# Altium footprint library DIP Component.PcbLib: 327 footprints (part 12 of 21)
Each footprint in its own frame and in the unit in brackets; x right, y up, seen from the top. Pads: shape width x height; smd on the part's side, far side on the other; paste and mask are expansions set on the pad; w line width, h text height; cw(c..) or ccw(c..) is an arc to the next point about the centre after c.
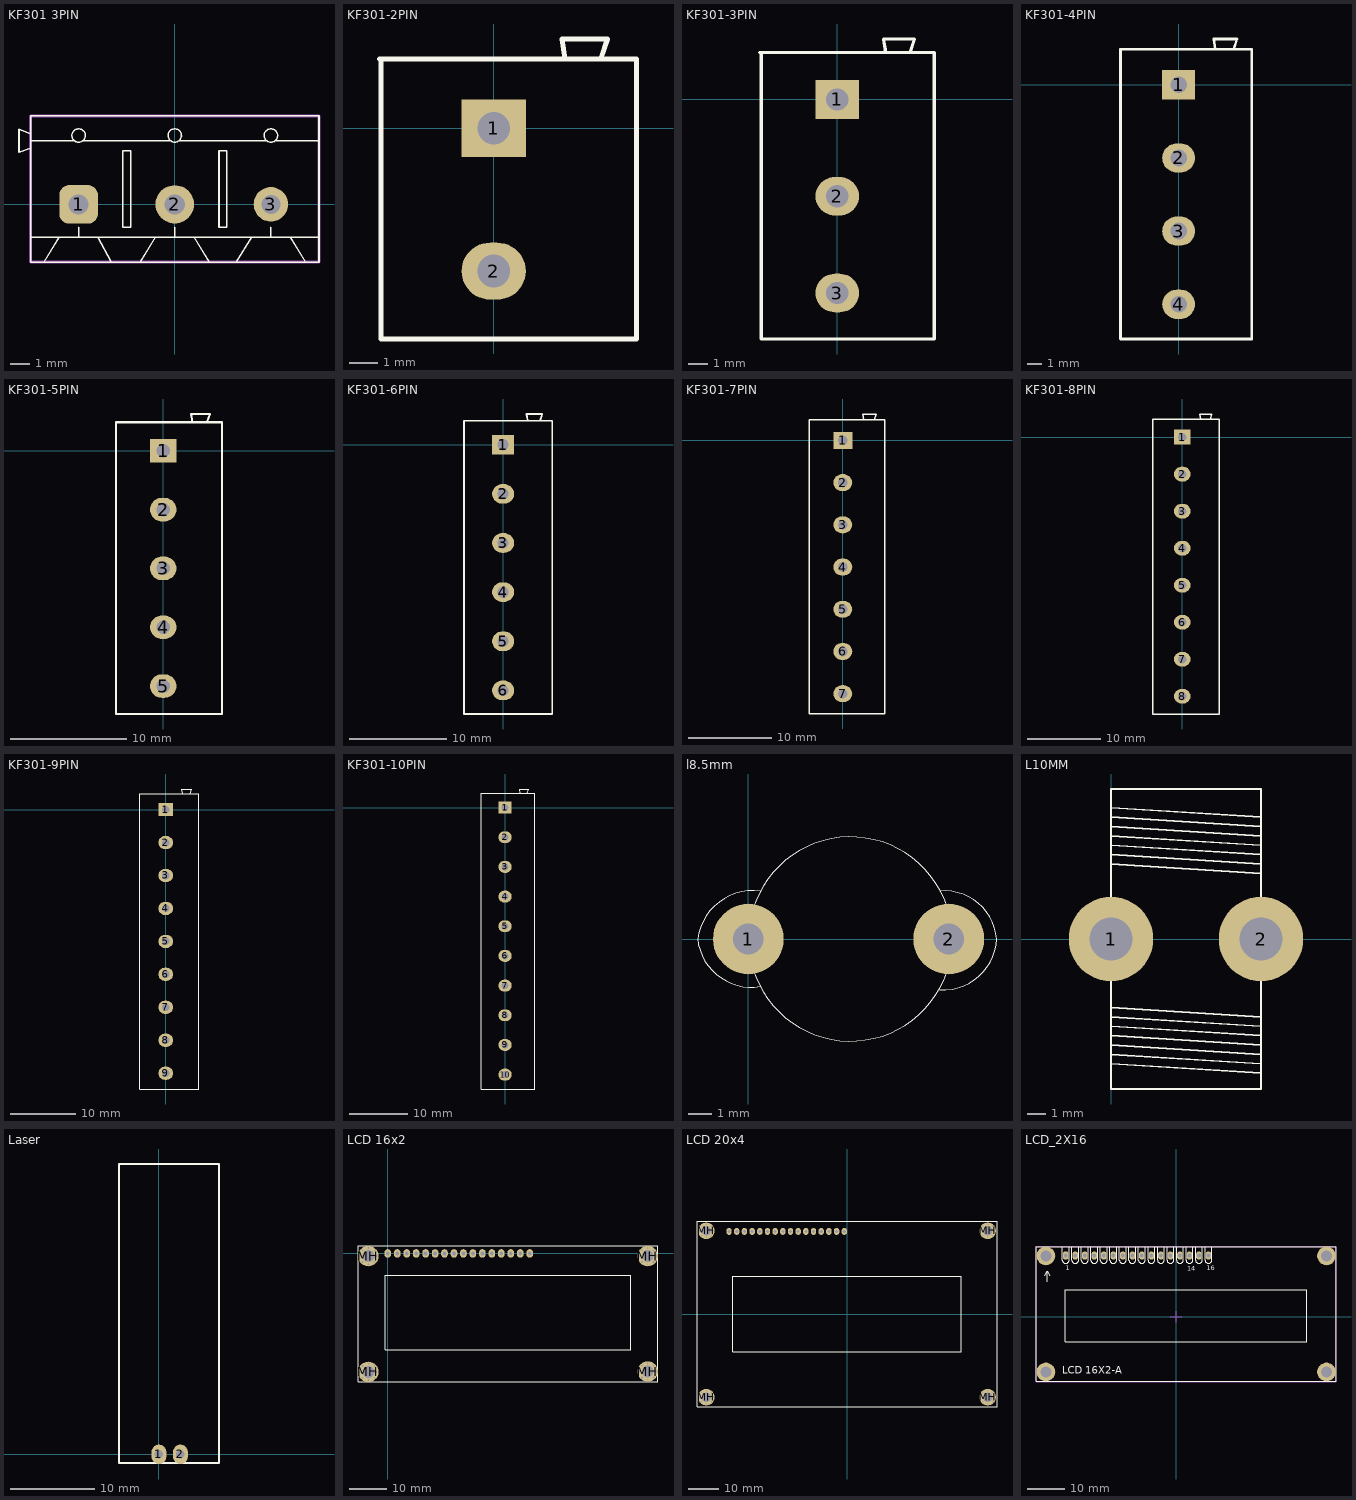
[diagram p11: the footprints below, top view; thin cyan lines are the x and y axes]

## KF301 3PIN [mm] "Designer Abbas Basereh"
height 7.5
pads (3):
  rrect50% 2x2 hole 1.05: 1(-5,0)
  round 2 hole 1.05: 2(0,0)
  round 1.8 hole 1: 3(5,0)
Top Overlay:
  lines w0.08: -6.8,-3 -6,-1.7 -4,-1.7 -3.3,-3 ; -5,-1.7 -5,-1.2 ; -1.8,-3 -1,-1.7 1,-1.7 1.8,-3 ; 0,-1.7 0,-1.2 ; 3.2,-3 4,-1.7 6,-1.7 6.8,-3 ; 5,-1.7 5,-1.2 ; -8.1,2.7 -7.5,2.918 ; -8.1,2.7 -8.1,3.9 ; -8.1,2.7 -8.1,3.9 ; -8.1,2.7 -7.5,2.918 ; -8.1,3.9 -7.5,3.681 ; -8.1,3.9 -7.5,3.681 ; -7.5,-3 -7.5,-1.7 ; -7.5,-3 7.5,-3 ; -7.5,-3 -7.5,2.918 ; -7.5,-3 7.5,-3 ; -7.5,-1.7 -7.5,3.3 ; -7.5,-1.7 7.5,-1.7 ; -7.5,3.3 -7.5,4.6 ; -7.5,3.3 -5.21,3.3 ; -7.5,3.681 -7.5,4.6 ; -7.5,4.6 7.5,4.6 ; -7.5,4.6 7.5,4.6 ; -5.21,3.3 ccw(c-5,3.58) -4.79,3.3 ; -5.21,3.3 cw(c-5,3.58) -4.79,3.3 ; -4.79,3.3 -0.21,3.3 ; -0.21,3.3 ccw(c0,3.58) 0.21,3.3 ; -0.21,3.3 cw(c0,3.58) 0.21,3.3 ; 0.21,3.3 4.79,3.3 ; 4.79,3.3 ccw(c5,3.58) 5.21,3.3 ; 4.79,3.3 cw(c5,3.58) 5.21,3.3 ; 5.21,3.3 7.5,3.3 ; 7.5,-3 7.5,-1.7 ; 7.5,-3 7.5,4.6 ; 7.5,-1.7 7.5,3.3 ; 7.5,3.3 7.5,4.6 ; -2.7,-1.2 -2.3,-1.2 -2.3,2.8 -2.7,2.8 -2.7,-1.2 ; 2.3,-1.2 2.3,2.8 2.7,2.8 2.7,-1.2 2.3,-1.2
Mechanical 15:
  lines w0.15: -7.5,-3 7.5,-3 7.5,4.6 -7.5,4.6 -7.5,-3
3D body "User Library-Terminal-Screw-3A-3way.STEP": height 10, standoff -3, extent -8.1,-3 7.5,4.6

## KF301-2PIN [mil]
pads (2):
  rect 90x80 hole 46: 1(0,0)
  oval 90x80 hole 46: 2(0,-200)
Top Overlay:
  lines w7: 100,97 95.33,125 159.33,125 150,97 ; -160,97 200,97 200,-295 -158,-295 -158,97 ; -160,97 -158,97 ; -160,97 -159,97 -158,97
3D body "Socket Blue_2Pin.STEP": height 493, standoff -263.18, extent -157,-295.46 200,127.46

## KF301-3PIN [mil]
pads (3):
  rect 90x80 hole 46: 1(0,0)
  oval 90x80 hole 46: 2(0,-200) 3(0,-400)
Top Overlay:
  lines w7: 100,97 95.33,125 159.33,125 150,97 ; -160,97 200,97 200,-495.05 -157.44,-495.05 -157.44,97 -160,97
3D body "Socket Blue_3Pin.STEP": height 503, standoff -253.18, extent -157.44,-495.05 199.56,127.87

## KF301-4PIN [mil]
pads (4):
  rect 90x80 hole 46: 1(0,0)
  oval 90x80 hole 46: 2(0,-200) 3(0,-400) 4(0,-600)
Top Overlay:
  lines w7: 100,97 95.33,125 159.33,125 150,97 ; -160,97 -159,97 ; -160,97 -158,97 -159,97 ; -160,97 200,97 200,-694.91 -159,-694.91 -159,97
3D body "Socket Blue_4Pin.STEP": height 493, standoff -263.18, extent -159,-694.91 198,128

## KF301-5PIN [mil]
pads (5):
  rect 90x80 hole 46: 1(0,0)
  oval 90x80 hole 46: 2(0,-200) 3(0,-400) 4(0,-600) 5(0,-800)
Top Overlay:
  lines w7: 100,97 95.33,125 159.33,125 150,97 ; -160,-895 -160,97 200,97 200,-895 -160,-895
3D body "Socket Blue_5Pin.STEP": height 493, standoff -263.18, extent -158.5,-897.91 198.5,125

## KF301-6PIN [mil]
pads (6):
  rect 90x80 hole 46: 1(0,0)
  oval 90x80 hole 46: 2(0,-200) 3(0,-400) 4(0,-600) 5(0,-800) 6(0,-1000)
Top Overlay:
  lines w7: -158,97 -160,97 ; 100,97 95.33,125 159.33,125 150,97 ; -160,97 -159,97 -159,-1096 200,-1096 200,97 -160,97
3D body "Socket Blue_6Pin.STEP": height 493, standoff -263.18, extent -159,-1096 198,126.91

## KF301-7PIN [mil]
pads (7):
  rect 90x80 hole 46: 1(0,0)
  oval 90x80 hole 46: 2(0,-200) 3(0,-400) 4(0,-600) 5(0,-800) 6(0,-1000) 7(0,-1200)
Top Overlay:
  lines w7: -160,97 200,97 200,-1296.28 -159.15,-1296.28 -159.15,97 ; 100,97 95.33,125 159.33,125 150,97
3D body "Socket Blue_7Pin.STEP": height 493, standoff -263.18, extent -159.15,-1296.28 197.85,126.64

## KF301-8PIN [mil]
pads (8):
  rect 90x80 hole 46: 1(0,0)
  oval 90x80 hole 46: 2(0,-200) 3(0,-400) 4(0,-600) 5(0,-800) 6(0,-1000) 7(0,-1200) 8(0,-1400)
Top Overlay:
  lines w7: -159.5,97 -159.5,-1495.91 200,-1495.91 200,97 -160,97 -158,97 ; 100,97 95.33,125 159.33,125 150,97
3D body "Socket Blue_8Pin.STEP": height 493, standoff -263.18, extent -159.5,-1495.91 197.5,127

## KF301-9PIN [mil]
pads (9):
  rect 90x80 hole 46: 1(0,0)
  oval 90x80 hole 46: 2(0,-200) 3(0,-400) 4(0,-600) 5(0,-800) 6(0,-1000) 7(0,-1200) 8(0,-1400) 9(0,-1600)
Top Overlay:
  lines w7: 100,97 95.33,125 159.33,125 150,97 ; -160,97 200,97 200,-1696 -158,-1696 -158,97 -160,97
3D body "Socket Blue_9Pin.STEP": height 493, standoff -263.18, extent -158,-1696 199,126.91

## KF301-10PIN [mil]
pads (10):
  rect 90x80 hole 46: 1(0,0)
  oval 90x80 hole 46: 2(0,-200) 3(0,-400) 4(0,-600) 5(0,-800) 6(0,-1000) 7(0,-1200) 8(0,-1400) 9(0,-1600) 10(0,-1800)
Top Overlay:
  lines w7: 100,97 95.33,125 159.33,125 150,97 ; -160,-1897 200,-1897 200,97 -160,97 -160,-1897
3D body "Socket Blue_10Pin.STEP": height 493, standoff -263.18, extent -160.5,-1896 196.5,127

## l8.5mm [mm] "L8.5mm"
pads (2):
  round 3 hole 1.3: 1(0,0) 2(8.5,0)
Top Overlay:
  circle w0.05: c4.331,0 r4.331
  lines w0.05: 0.505,-2.015 cw(c0.127,0.254) -2.159,0 cw(c0.191,-0.318) 0.508,2.032 ; 8.128,-2.159 ccw(c8.255,0.127) 10.541,0 ccw(c8.319,-0.19) 8.128,2.032

## L10MM [mm]
pads (2):
  round 4.5 hole 2.3: 1(0,0) 2(8,0)
Top Overlay:
  lines w0.1: 0,-3.656 8,-4.156 8,-4.656 0,-4.156 0,-4.656 8,-5.156 8,-5.656 0,-5.156 0,-5.656 8,-6.156 8,-6.656 0,-6.156 0,-6.656 8,-7.156 ; 8,3.5 0,4 0,4.5 8,4 8,4.5 0,5 0,5.5 8,5 8,5.5 0,6 0,6.5 8,6 8,6.5 0,7 0,0 ; 0,0 0,-8 8,-8 8,0 8,8 0,8 0,0

## Laser [mil]
pads (2):
  oval 70x90 hole 40: 1(0,0) 2(100,0)
Top Overlay:
  lines w10: -186.22,-40 280,-40 280,1349.21 -186.22,1349.21 -186.22,-40
3D body: height 241.21, standoff 231.23, extent 45,1160 54.96,2160
3D body "laser.STEP": height 472.44, standoff 0, extent -186.22,50 286.22,1435.83

## LCD 16x2 [mm] "Character LCD, 2 Row, 16 Colunm"
pads (52):
  oval 1.778x2.286 hole 1.016: 1(0,0) 2(2.54,0) 3(5.08,0) 4(7.62,0) 5(10.16,0) 6(12.7,0) 7(15.24,0) 8(17.78,0) 9(20.32,0) 10(22.86,0) 11(25.4,0) 12(27.94,0) 13(30.48,0) 14(33.02,0) 15(35.56,0) 16(38.1,0)
  round 0.6 hole 0.5: MH(-7.4,-31.8) MH(-7.4,-0.7) MH(-6.756,-33.356) MH(-6.756,-30.244) MH(-6.756,-2.256) MH(-6.756,0.856) MH(-5.2,-34) MH(-5.2,-29.6) MH(-5.2,-2.9) MH(-5.2,1.5) MH(-3.644,-33.356) MH(-3.644,-30.244) MH(-3.644,-2.256) MH(-3.644,0.856) MH(-3,-31.8) MH(-3,-0.7) MH(67.6,-31.7) MH(67.6,-0.7) MH(68.244,-33.256) MH(68.244,-30.144) MH(68.244,-2.256) MH(68.244,0.856) MH(69.8,-33.9) MH(69.8,-29.5) MH(69.8,-2.9) MH(69.8,1.5) MH(71.356,-33.256) MH(71.356,-30.144) MH(71.356,-2.256) MH(71.356,0.856) MH(72,-31.7) MH(72,-0.7)
  round 5.5 hole 3.2: MH(-5.2,-31.8) MH(-5.2,-0.7) MH(69.8,-31.7) MH(69.8,-0.7)
Top Overlay:
  lines w0.254: -7.992,-34.468 -7.992,2.032 72.508,2.032 72.508,-34.468 -7.992,-34.468 ; -0.7,-25.9 -0.7,-5.9 65.3,-5.9 65.3,-25.9 -0.7,-25.9
3D body "header16-15mm.STEP": height 18.03, standoff -2.54, extent -1.27,-1.27 39.37,1.27
3D body "My LCD.STEP": height 25.52, standoff 12.31, extent -7.992,-34.468 72.508,2.032
3D body "14801-15 H.STEP": height 18.71, standoff -3.71, extent -7.5,-3 -2.9,1.6
3D body "14801-15 H.STEP": height 18.71, standoff -3.71, extent -7.5,-34.1 -2.9,-29.5
3D body "14801-15 H.STEP": height 18.71, standoff -3.71, extent 67.5,-34 72.1,-29.4
3D body "14801-15 H.STEP": height 18.71, standoff -3.71, extent 67.5,-3 72.1,1.6

## LCD 20x4 [mm] "4 line x 20 characters LCD"
pads (52):
  oval 1.778x2.286 hole 1.016: 1(-39,27.3) 2(-36.46,27.3) 3(-33.92,27.3) 4(-31.38,27.3) 5(-28.84,27.3) 6(-26.3,27.3) 7(-23.76,27.3) 8(-21.22,27.3) 9(-18.68,27.3) 10(-16.14,27.3) 11(-13.6,27.3) 12(-11.06,27.3) 13(-8.52,27.3) 14(-5.98,27.3) 15(-3.44,27.3) 16(-0.9,27.3)
  round 1 hole 0.5: MH(-48.7,-27.5) MH(-48.7,27.5) MH(-48.056,-29.056) MH(-48.056,-25.944) MH(-48.056,25.944) MH(-48.056,29.056) MH(-46.5,-29.7) MH(-46.5,-25.3) MH(-46.5,25.3) MH(-46.5,29.7) MH(-44.944,-29.056) MH(-44.944,-25.944) MH(-44.944,25.944) MH(-44.944,29.056) MH(-44.3,-27.5) MH(-44.3,27.5) MH(44.3,-27.5) MH(44.3,27.5) MH(44.944,-29.056) MH(44.944,-25.944) MH(44.944,25.944) MH(44.944,29.056) MH(46.5,-29.7) MH(46.5,-25.3) MH(46.5,25.3) MH(46.5,29.7) MH(48.056,-29.056) MH(48.056,-25.944) MH(48.056,25.944) MH(48.056,29.056) MH(48.7,-27.5) MH(48.7,27.5)
  round 5.5 hole 3.2: MH(-46.5,-27.5) MH(-46.5,27.5) MH(46.5,-27.5) MH(46.5,27.5)
Top Overlay:
  lines w0.254: -49.6,-30.6 49.6,-30.6 49.6,30.6 -49.6,30.6 -49.6,-30.6 ; -37.8,-12.5 37.8,-12.5 37.8,12.5 -37.8,12.5 -37.8,-12.5
3D body "14801-15 H.STEP": height 18.71, standoff -3.71, extent -48.8,25.2 -44.2,29.8
3D body "User Library-LCD 20 x 4.STEP": height 26.17, standoff 15.07, extent -49,-30 49,30
3D body "header16-15mm.STEP": height 18.03, standoff -2.54, extent -40.27,26.03 0.37,28.57
3D body "14801-15 H.STEP": height 18.71, standoff -3.71, extent -48.8,-29.8 -44.2,-25.2
3D body "14801-15 H.STEP": height 18.71, standoff -3.71, extent 44.2,-29.8 48.8,-25.2
3D body "14801-15 H.STEP": height 18.71, standoff -3.71, extent 44.2,25.2 48.8,29.8

## LCD_2X16 [mm] "LCD 2x16 Alphanumberic-Designer Abbas Basereh"
height 50
pads (20):
  oct 1.5x2.2 hole 1: 1(-29.464,16.3)
  oval 1.5x2.2 hole 1: 2(-26.924,16.3) 3(-24.384,16.3) 4(-21.844,16.3) 5(-19.304,16.3) 6(-16.764,16.3) 7(-14.224,16.3) 8(-11.684,16.3) 9(-9.144,16.3) 10(-6.604,16.3) 11(-4.064,16.3) 12(-1.524,16.3) 13(1.016,16.3) 14(3.556,16.3) 15(6.096,16.3) 16(8.636,16.3)
  round 5 hole 3: ""(-34.756,-14.775) ""(-34.756,16.213) ""(40.174,-14.775) ""(40.174,16.213)
Top Overlay:
  circle w0.2: c40.204,16.213 r1.25
  circle w0.2: c-34.796,16.213 r1.25
  circle w0.2: c40.204,-14.788 r1.25
  circle w0.2: c-34.796,-14.788 r1.25
  lines w0.2: -35.01,10.879 -34.375,12.149 -33.74,10.879 ; -34.375,9.337 -34.375,12.022 ; -30.353,18.669 -30.353,15.113 ccw(c-29.464,15.113) -28.575,15.113 -28.575,18.669 ; -27.813,18.669 -27.813,15.113 ccw(c-26.924,15.113) -26.035,15.113 -26.035,18.669 ; -25.273,18.669 -25.273,15.113 ccw(c-24.384,15.113) -23.495,15.113 -23.495,18.669 ; -22.733,18.669 -22.733,15.113 ccw(c-21.844,15.113) -20.955,15.113 -20.955,18.669 ; -20.193,18.669 -20.193,15.113 ccw(c-19.304,15.113) -18.415,15.113 -18.415,18.669 ; -17.653,18.669 -17.653,15.113 ccw(c-16.764,15.113) -15.875,15.113 -15.875,18.669 ; -15.113,18.669 -15.113,15.113 ccw(c-14.224,15.113) -13.335,15.113 -13.335,18.669 ; -12.573,18.669 -12.573,15.113 ccw(c-11.684,15.113) -10.795,15.113 -10.795,18.669 ; -10.033,18.669 -10.033,15.113 ccw(c-9.144,15.113) -8.255,15.113 -8.255,18.669 ; -7.493,18.669 -7.493,15.113 ccw(c-6.604,15.113) -5.715,15.113 -5.715,18.669 ; -4.953,18.669 -4.953,15.113 ccw(c-4.064,15.113) -3.175,15.113 -3.175,18.669 ; -2.413,18.669 -2.413,15.113 ccw(c-1.524,15.113) -0.635,15.113 -0.635,18.669 ; 0.127,18.669 0.127,15.113 ccw(c1.016,15.113) 1.905,15.113 1.905,18.669 ; 2.667,18.669 2.667,15.113 ccw(c3.556,15.113) 4.445,15.113 4.445,18.669 ; 5.207,18.669 5.207,15.113 ccw(c6.096,15.113) 6.985,15.113 6.985,18.669 ; 7.747,18.669 7.747,15.113 ccw(c8.636,15.113) 9.525,15.113 9.525,18.669 ; -37.296,-17.288 -37.296,18.712 42.704,18.712 42.704,-17.288 -37.296,-17.288 ; -29.546,-6.688 34.954,-6.688 34.954,7.112 -29.546,7.112 -29.546,-6.688
  text "LCD 16X2-A" at -30.438,-15.283 h1.91
  text "16" at 8.128,12.446 h1.27
  text "1" at -29.464,12.446 h1.27
  text "14" at 3.048,12.192 h1.27
Mechanical 15:
  lines w0.15: -1.5,0 1.5,0 ; 0,-1.5 0,1.5 ; -37.4,-17.4 -37.4,18.8 42.7,18.8 42.7,-17.4 -37.4,-17.4
3D body "User Library-AC162B.STEP": height 21, standoff 7.1, extent -37.35,-17.3 42.65,18.7
3D body: height 10, standoff 0, extent 37.592,13.589 42.799,18.796
3D body: height 10, standoff 0, extent 37.592,-17.399 42.799,-12.192
3D body: height 10, standoff 0, extent -37.338,-17.399 -32.131,-12.192
3D body: height 10, standoff 0, extent -37.338,13.589 -32.131,18.796